# Altium footprint library North POLE.PcbLib: 419 footprints (part 25 of 27)
Each footprint in its own frame and in the unit in brackets; x right, y up, seen from the top. Pads: shape width x height; smd on the part's side, far side on the other; paste and mask are expansions set on the pad; w line width, h text height; cw(c..) or ccw(c..) is an arc to the next point about the centre after c.
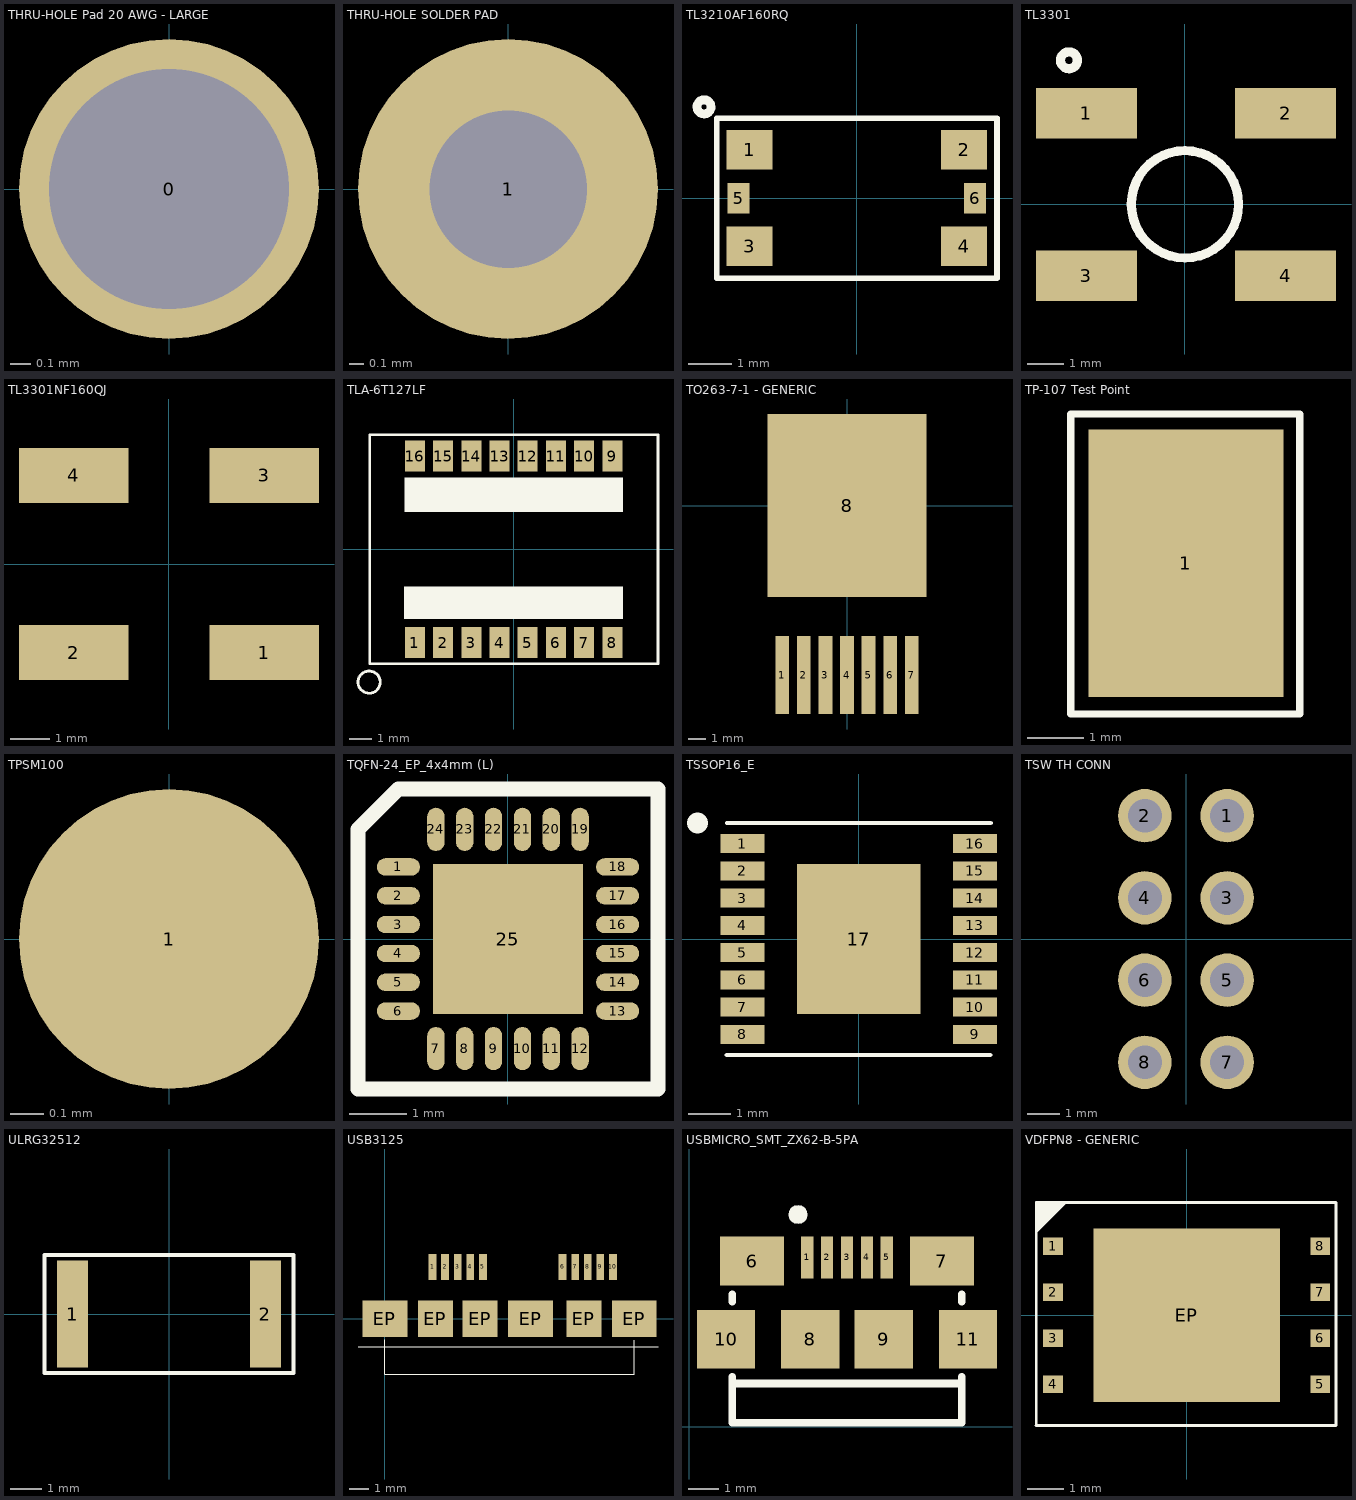
[diagram p24: the footprints below, top view; thin cyan lines are the x and y axes]

## THRU-HOLE Pad 20 AWG - LARGE [mm]
pads (1):
  round 1.5 hole 1.2 mask+0.5: 0(0,0)

## THRU-HOLE SOLDER PAD [mil]
pads (1):
  round 80 hole 42: 1(0,0)

## TL3210AF160RQ [mm]
pads (6):
  rect 1.05x0.9 smd: 1(-2.45,1.1) 2(2.45,1.1) 3(-2.45,-1.1) 4(2.45,-1.1)
  rect 0.5x0.7 smd: 5(-2.7,0) 6(2.7,0)
Top Overlay:
  lines w0.127: -3.2,-1.827 3.2,-1.827 3.2,1.827 -3.2,1.827 -3.2,-1.827
  lines w0.2: -3.343,2.152 ccw(c-3.488,2.083) -3.327,2.083
3D body: height 3.12, standoff 0, extent -3.1,-1.7 3.1,1.7

## TL3301 [mm] "Push button"
pads (4):
  rect 2.794x1.397 smd: 1(-2.73,2.52) 2(2.79,2.52) 3(-2.73,-1.98) 4(2.79,-1.98)
Top Overlay:
  circle w0.254: c-3.213,3.99 r0.233
  circle w0.254: c0,0 r1.486

## TL3301NF160QJ [mm] "Push button"
pads (4):
  rect 2.785x1.4 smd: 1(2.418,-2.25) 2(-2.418,-2.25) 3(2.418,2.25) 4(-2.418,2.25)
3D body: height 4.37, standoff -0.03, extent -3.3,-3 3.3,3

## TLA-6T127LF [mm]
pads (16):
  rect 0.9x1.4 smd mask+0.08: 1(-4.445,-4.2) 2(-3.175,-4.2) 3(-1.905,-4.2) 4(-0.635,-4.2) 5(0.635,-4.2) 6(1.905,-4.2) 7(3.175,-4.2) 8(4.445,-4.2) 9(4.445,4.2) 10(3.175,4.2) 11(1.905,4.2) 12(0.635,4.2) 13(-0.635,4.2) 14(-1.905,4.2) 15(-3.175,4.2) 16(-4.445,4.2)
Top Overlay:
  rectangle: -4.92,1.676 4.925,3.226
  region: 4.92,-1.676 -4.925,-1.676 -4.925,-3.15 4.92,-3.15
  lines w0.127: -6.165,-5.617 ccw(c-6.507,-5.981) -6.121,-5.664 ; -6.477,-5.156 -6.477,5.156 6.502,5.156 6.502,-5.156 -6.477,-5.156
3D body: height 5.1, standoff 0, extent -6.35,-4.7 6.35,4.7

## TO263-7-1 - GENERIC [mm]
pads (8):
  rect 0.8x4.6 smd: 1(-3.81,-10) 2(-2.54,-10) 3(-1.27,-10) 4(0,-10) 5(1.27,-10) 6(2.54,-10) 7(3.81,-10)
  rect 9.4x10.8 smd: 8(0,0)
3D body: height 4.78, standoff -0.02, extent -5,-11.594 5,4.076

## TP-107 Test Point [mm]
pads (1):
  rect 3.429x4.699 smd: 1(-1254.075,-1259.725)
Top Overlay:
  lines w0.127: -1256.1,-1262.375 -1252.075,-1262.375 -1252.075,-1257.1 -1256.1,-1257.1 -1256.1,-1257.275 -1256.1,-1262.375
3D body: height 2.29, standoff 0, extent -1255.162,-1261.625 -1252.987,-1257.825

## TPSM100 [mil] "0.035 SMT Testpoint"
pads (1):
  round 35 smd: 1(0,0)

## TQFN-24_EP_4x4mm (L) [mm]
pads (25):
  oval 0.75x0.3 smd paste-0.127 mask+0.125: 1(-1.9,1.25) 2(-1.9,0.75) 3(-1.9,0.25) 4(-1.9,-0.25) 5(-1.9,-0.75) 6(-1.9,-1.25) 13(1.9,-1.25) 14(1.9,-0.75) 15(1.9,-0.25) 16(1.9,0.25) 17(1.9,0.75) 18(1.9,1.25)
  oval 0.3x0.75 smd paste-0.127 mask+0.125: 7(-1.25,-1.9) 8(-0.75,-1.9) 9(-0.25,-1.9) 10(0.25,-1.9) 11(0.75,-1.9) 12(1.25,-1.9) 19(1.25,1.9) 20(0.75,1.9) 21(0.25,1.9) 22(-0.25,1.9) 23(-0.75,1.9) 24(-1.25,1.9)
  rect 2.6x2.6 smd paste-0.13 mask+0.13: 25(0,0)
Top Overlay:
  lines w0.254: -2.6,-2.6 2.6,-2.6 2.6,2.6 -1.905,2.6 -2.6,1.905 -2.6,-2.6
3D body: height 1, standoff 0, extent -2.5,-2.5 2.5,2.5

## TSSOP16_E [mm]
pads (17):
  rect 1.05x0.45 smd mask+0.08: 1(-2.775,2.275) 2(-2.775,1.625) 3(-2.775,0.975) 4(-2.775,0.325) 5(-2.775,-0.325) 6(-2.775,-0.975) 7(-2.775,-1.625) 8(-2.775,-2.275) 9(2.775,-2.275) 10(2.775,-1.625) 11(2.775,-0.975) 12(2.775,-0.325) 13(2.775,0.325) 14(2.775,0.975) 15(2.775,1.625) 16(2.775,2.275)
  rect 2.94x3.58 smd mask+0.08: 17(0,0)
Top Overlay:
  lines w0.1: -3.15,-2.77 3.14,-2.77 ; -3.14,2.77 3.15,2.77
  lines w0.5: -3.851,2.771 cw(c-3.853,2.766) -3.85,2.77
3D body: height 1.1, standoff 0, extent -3.2,-2.51 3.2,2.49

## TSW TH CONN [mil] "0.156-inch-separation 1x2 header with shroud"
pads (8):
  round 65 hole 41: 1(50,150) 2(-50,150) 3(50,50) 4(-50,50) 5(50,-50) 6(-50,-50) 7(50,-150) 8(-50,-150)

## ULRG32512 [mm]
pads (2):
  rect 1x3.45 smd mask+0.08: 1(-3.1,0) 2(3.1,0)
Top Overlay:
  lines w0.127: -4,-1.9 4,-1.9 4,1.9 -4,1.9 -4,-1.9
3D body: height 0.62, standoff 0, extent -3.162,-1.613 3.157,1.587

## USB3125 [mm] "usb 3.0 micro receptacle type ab, horizontal 10 pin."
pads (16):
  rect 0.4x1.35 smd: 1(2.45,2.67) 2(3.1,2.67) 3(3.75,2.67) 4(4.4,2.67) 5(5.05,2.67) 6(9.15,2.67) 7(9.8,2.67) 8(10.45,2.67) 9(11.1,2.67) 10(11.75,2.67)
  rect 2.3x1.9 smd: EP(0,0) EP(7.5,0) EP(12.85,0)
  rect 1.8x1.9 smd: EP(2.6,0) EP(4.9,0) EP(10.25,0)
Top Overlay:
  lines w0.01: 0,-1.07 0,-2.85 12.85,-2.85 12.85,-1.1
  lines w0.025: -1.39,-1.45 14.07,-1.45

## USBMICRO_SMT_ZX62-B-5PA [mm]
pads (11):
  rect 0.4x1.36 smd paste+0 mask+0.25: 1(3.854,5.527) 2(4.504,5.527) 3(5.154,5.527) 4(5.804,5.527) 5(6.454,5.527)
  rect 2.1x1.6 smd paste+0 mask+0.25: 6(2.054,5.407) 7(8.254,5.407)
  rect 1.9x1.9 smd paste+0 mask+0.25: 8(3.954,2.857) 9(6.354,2.857) 10(1.204,2.857) 11(9.104,2.857)
Top Overlay:
  region: 3.554,6.621 3.437,6.644 3.338,6.711 3.271,6.81 3.248,6.927 3.271,7.044 3.338,7.143 3.437,7.21 3.554,7.233 3.671,7.21 3.77,7.143 3.837,7.044 3.86,6.927 3.837,6.81 3.77,6.711 3.671,6.644
  lines w0.254: 1.404,1.627 1.404,1.407 ; 1.404,4.077 1.404,4.327 ; 8.904,1.627 8.904,1.407 ; 8.904,4.077 8.904,4.327 ; 1.404,1.407 8.904,1.407 ; 1.404,1.407 1.404,0.127 8.904,0.127 8.904,1.407

## VDFPN8 - GENERIC [mm]
pads (9):
  rect 0.55x0.48 smd mask+0.08: 1(-3.69,1.905) 2(-3.69,0.635) 3(-3.69,-0.635) 4(-3.69,-1.905) 5(3.69,-1.905) 6(3.69,-0.635) 7(3.69,0.635) 8(3.69,1.905)
  rect 5.16x4.8 smd mask+0.08: EP(0,0)
Top Overlay:
  region: -4.156,3.116 -4.156,2.286 -4.132,2.286 -3.302,3.116
  lines w0.076: -4.162,-3.048 4.124,-3.048 4.124,3.116 -4.156,3.116 -4.156,-3.043
3D body: height 1, standoff 0, extent -4.067,-2.977 4.019,2.992